# Altium footprint library ParsaLibrary.PcbLib: 526 footprints (part 16 of 33)
Each footprint in its own frame and in the unit in brackets; x right, y up, seen from the top. Pads: shape width x height; smd on the part's side, far side on the other; paste and mask are expansions set on the pad; w line width, h text height; cw(c..) or ccw(c..) is an arc to the next point about the centre after c.
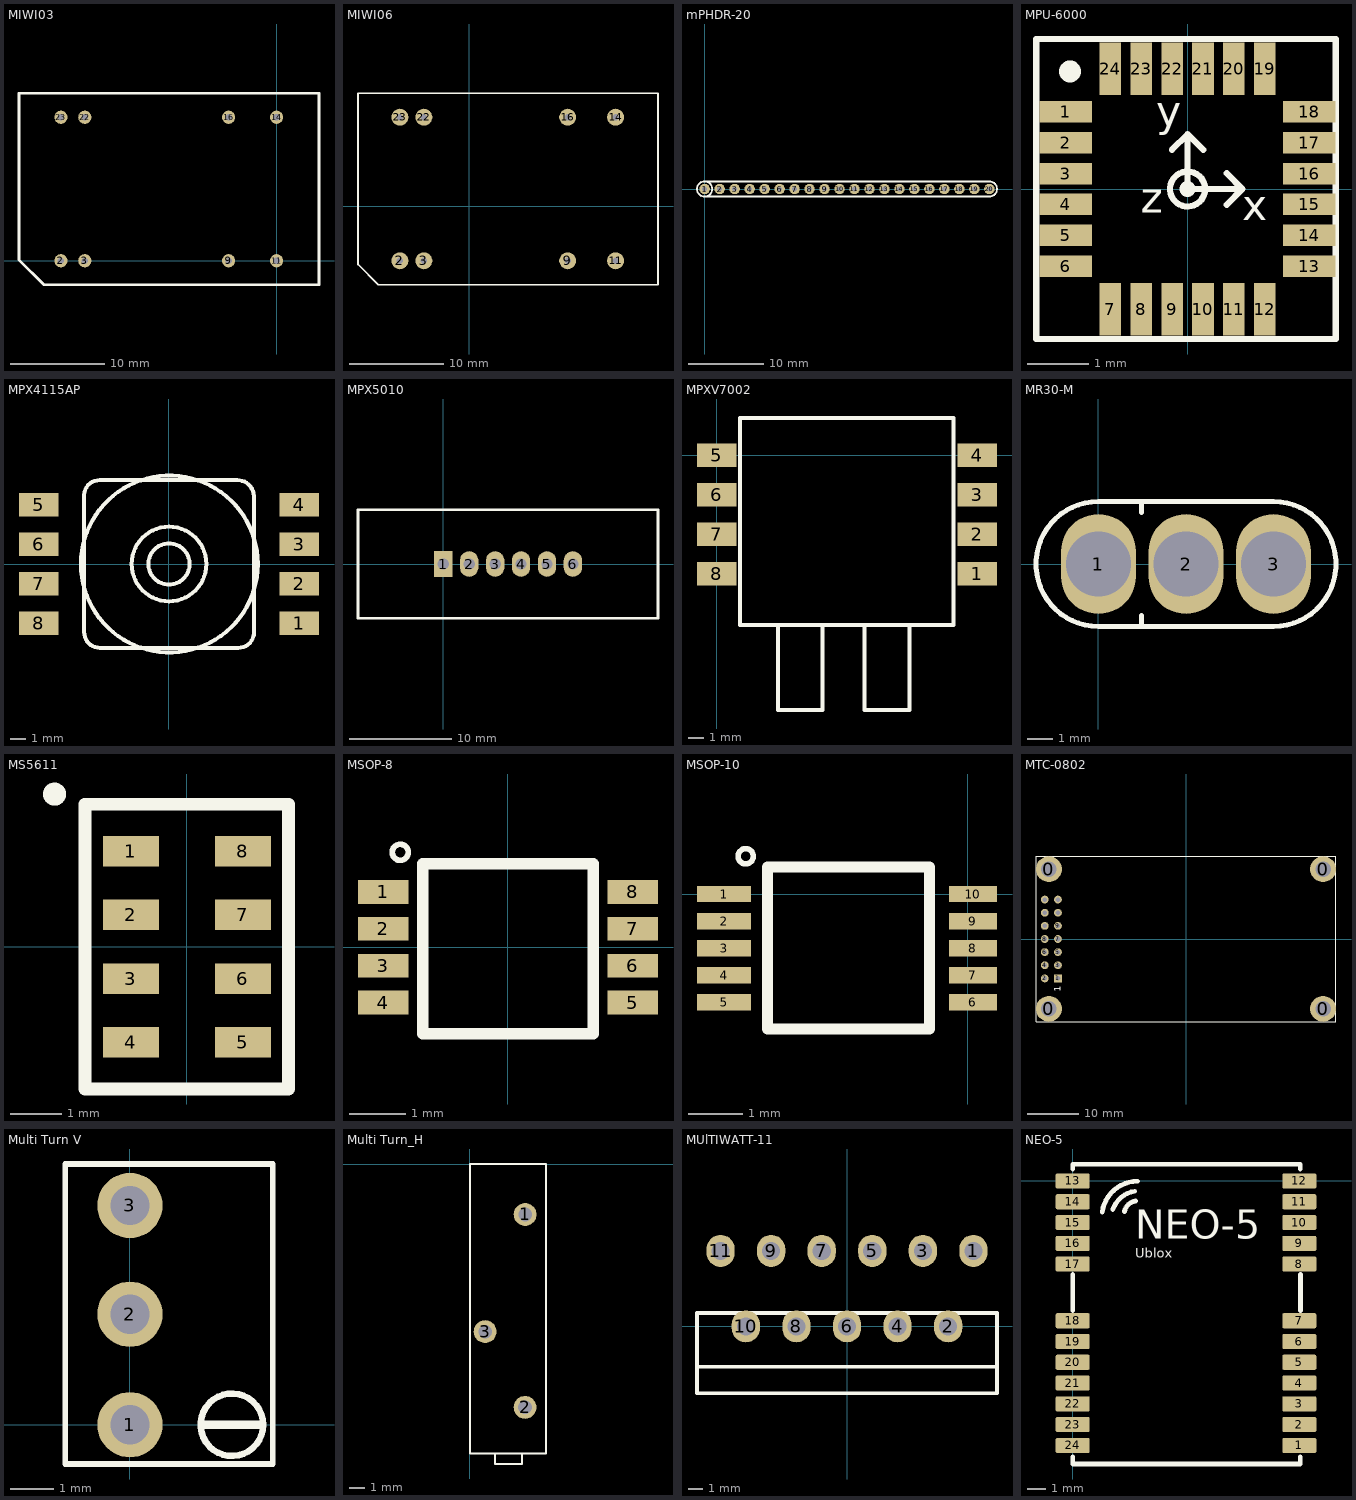
[diagram p15: the footprints below, top view; thin cyan lines are the x and y axes]

## MIWI03 [mm]
pads (8):
  round 1.4 hole 0.7: 2(-22.86,0) 3(-20.32,0) 9(-5.08,0) 11(0,0) 14(0,15.22) 16(-5.08,15.22) 22(-20.32,15.22) 23(-22.86,15.22)
Top Overlay:
  lines w0.3: -27.3,0.097 -24.663,-2.54 4.5,-2.54 4.5,17.76 -27.3,17.76 -27.3,0.097

## MIWI06 [mm] "DC/DC CONVERTER 6W, Single & Dual Output"
pads (8):
  round 1.8 hole 0.7: 2(-7.328,-5.801) 3(-4.788,-5.801) 9(10.452,-5.801) 11(15.532,-5.801) 14(15.532,9.419) 16(10.452,9.419) 22(-4.788,9.419) 23(-7.328,9.419)
Top Overlay:
  lines w0.2: -11.773,11.959 -11.773,-6.182 -9.614,-8.341 20.027,-8.341 ; -11.718,11.959 20.032,11.959 20.032,-8.341
3D body "User Library-MIW4037.step": height 10.25, standoff -4, extent -11.767,-8.377 20.033,11.923

## mPHDR-20 [mm]
pads (20):
  round 1.4 hole 0.7: 1(0,0) 2(2,0) 3(4,0) 4(6,0) 5(8,0) 6(10,0) 7(12,0) 8(14,0) 9(16,0) 10(18,0) 11(20,0) 12(22,0) 13(24,0) 14(26,0) 15(28,0) 16(30,0) 17(32,0) 18(34,0) 19(36,0) 20(38,0)
Top Overlay:
  circle w0.254: c0,0 r1.016
  lines w0.254: 0,-1.016 38,-1.016 ccw(c38,0) 38,1.016 0,1.016

## MPU-6000 [mm] "MPU-6000/MPU-6050"
pads (24):
  rect 0.85x0.35 smd mask+0: 1(-1.975,1.25) 2(-1.975,0.75) 3(-1.975,0.25) 4(-1.975,-0.25) 5(-1.975,-0.75) 6(-1.975,-1.25) 13(1.975,-1.25) 14(1.975,-0.75) 15(1.975,-0.25) 16(1.975,0.25) 17(1.975,0.75) 18(1.975,1.25)
  rect 0.35x0.85 smd mask+0: 7(-1.25,-1.95) 8(-0.75,-1.95) 9(-0.25,-1.95) 10(0.25,-1.95) 11(0.75,-1.95) 12(1.25,-1.95) 19(1.25,1.95) 20(0.75,1.95) 21(0.25,1.95) 22(-0.25,1.95) 23(-0.75,1.95) 24(-1.25,1.95)
Top Overlay:
  circle w0.254: c-1.905,1.905 r0.05
  circle w0.254: c-0.001,0 r0.001
  circle w0.1: c0,0 r0.284
  lines w0.1: -0.254,0.635 0,0.889 ; 0.254,0.635 0,0.889 ; 0.635,-0.254 0.889,0 ; 0.635,0.254 0.889,0 ; 0,0.889 0,0 0.889,0 ; -2.45,-2.43 2.4,-2.43 2.4,2.43 -2.45,2.43 -2.45,-2.43
  text "z" at -0.762,-0.381 h0.5
  text "x" at 0.889,-0.508 h0.5
  text "y" at -0.508,1.016 h0.5

## MPX4115AP [mm]
pads (8):
  rect 2.54x1.524 smd: 1(8.38,-3.81) 2(8.38,-1.27) 3(8.38,1.27) 4(8.38,3.81) 5(-8.38,3.81) 6(-8.38,1.27) 7(-8.38,-1.27) 8(-8.38,-3.81)
Top Overlay:
  circle w0.254: c0.025,0 r5.69
  circle w0.254: c0,0 r2.4
  circle w0.254: c0,0 r1.326
  lines w0.254: -4.445,5.395 ccw(c-4.477,4.413) -5.459,4.445 -5.459,-4.381 ccw(c-4.445,-4.381) -4.445,-5.395 4.444,-5.395 ccw(c4.476,-4.413) 5.458,-4.445 ; -4.382,5.395 4.379,5.395 cw(c4.411,4.348) 5.458,4.381 5.458,-4.572

## MPX5010 [mm]
pads (6):
  rect 1.8x2.5 hole 1.1: 1(0,0)
  oval 1.8x2.5 hole 1.1: 2(2.54,0) 3(5.08,0) 4(7.62,0) 5(10.16,0) 6(12.7,0)
Top Overlay:
  lines w0.254: -8.36,-5.3 -8.36,5.3 21.04,5.3 21.04,-5.3 -8.36,-5.3

## MPXV7002 [mm]
pads (8):
  rect 2.54x1.52 smd: 1(16.76,-7.62) 2(16.76,-5.08) 3(16.76,-2.54) 4(16.76,0) 5(0,0) 6(0,-2.54) 7(0,-5.08) 8(0,-7.62)
Top Overlay:
  lines w0.254: 3.937,-10.922 3.937,-16.4 6.8,-16.4 6.8,-10.922 ; 9.5,-10.922 9.5,-16.4 12.4,-16.4 12.4,-10.922 ; 1.5,-10.922 1.5,2.4 15.24,2.4 15.24,1.27 15.24,-10.922 1.5,-10.922
3D body "MPXV7002.step": height 10.41, standoff -0.25, extent -0.522,-16.563 17.322,2.36

## MR30-M [mm]
pads (3):
  oval 3x4 hole 2.6: 1(0,0) 2(3.5,0) 3(7,0)
Top Overlay:
  lines w0.2: 1.727,-2.5 1.727,-2.068 ; 1.727,2.057 1.727,2.489 ; 0,-2.5 cw(c0,0) 0,2.5 7,2.5 cw(c7,0) 7,-2.5 0,-2.5
3D body "User Library-Amass MR30-M.step": height 10.5, standoff -3, extent -2.55,-2.55 9.55,2.55

## MS5611 [mm] "Digital pressure sensor"
pads (8):
  rect 1.1x0.6 smd: 1(-1.1,1.875) 2(-1.1,0.625) 3(-1.1,-0.625) 4(-1.1,-1.875) 5(1.1,-1.875) 6(1.1,-0.625) 7(1.1,0.625) 8(1.1,1.875)
Top Overlay:
  circle w0.254: c-2.6,3 r0.1
  lines w0.254: -2,-2.795 2,-2.795 2,2.8 -2,2.8 -2,-2.795
3D body "User Library-ms5611_STEP.x_b": height 1.02, standoff -0.01, extent -1.5,-2.5 1.5,2.5

## MSOP-8 [mm]
pads (8):
  rect 0.889x0.42 smd: 1(-2.2,0.975) 2(-2.2,0.325) 3(-2.2,-0.325) 4(-2.2,-0.975) 5(2.2,-0.975) 6(2.2,-0.325) 7(2.2,0.325) 8(2.2,0.975)
Top Overlay:
  circle w0.1: c-1.9,1.675 r0.141
  lines w0.203: -1.5,-1.525 1.5,-1.525 1.5,1.475 -1.5,1.475 -1.5,-1.525
3D body "User Library-MSOP-8-1.step": height 0.92, standoff 0, extent -2.5,-1.525 2.5,1.475

## MSOP-10 [mm]
pads (10):
  rect 1x0.3 smd: 1(-4.5,0) 2(-4.5,-0.5) 3(-4.5,-1) 4(-4.5,-1.5) 5(-4.5,-2)
  rect 0.889x0.3 smd: 6(0.1,-2) 7(0.1,-1.5) 8(0.1,-1) 9(0.1,-0.5) 10(0.1,0)
Top Overlay:
  circle w0.1: c-4.1,0.7 r0.141
  lines w0.203: -3.7,-2.493 -0.7,-2.493 -0.7,0.5 -3.7,0.5 -3.7,-2.493
3D body "User Library-MSOP-10-1.step": height 1.05, standoff 0, extent -4.74,-2.52 0.287,0.48

## MTC-0802 [mm]
pads (18):
  round 5 hole 3: 0(-26.5,-13.5) 0(-26.5,13.5) 0(26.5,-13.5) 0(26.5,13.5)
  rect 1.5x1.5 hole 0.9: 1(-24.76,-7.62)
  round 1.5 hole 0.9: 2(-27.3,-7.62) 3(-24.76,-5.08) 4(-27.3,-5.08) 5(-24.76,-2.54) 6(-27.3,-2.54) 7(-24.76,0) 8(-27.3,0) 9(-24.76,2.54) 10(-27.3,2.54) 11(-24.76,5.08) 12(-27.3,5.08) 13(-24.76,7.62) 14(-27.3,7.62)
Top Overlay:
  lines w0.2: 29,16 -29,16 -29,-16 29,-16 29,16.001
  text "1" at -24.252,-10.16 h1.27
3D body "User Library-lcd_8x2.STEP": height 16.2, standoff 7.99, extent -29,-16 29,16

## Multi Turn V [mm]
pads (3):
  round 1.5 hole 0.9: 1(0,0) 2(0,2.54) 3(0,5.04)
Top Overlay:
  circle w0.15: c2.346,0 r0.718
  lines w0.127: -1.483,-0.902 3.279,-0.902 3.279,5.993 -1.483,5.993 -1.483,-0.902
  lines w0.2: 1.696,0 2.95,0
3D body "User Library-T63YA.step": height 8.2, standoff -2.6, extent -1.422,-0.859 3.278,5.941

## Multi Turn_H [mm]
pads (3):
  round 1.5 hole 0.9: 1(3.627,-3.31) 2(3.621,-15.966) 3(1,-11)
Top Overlay:
  lines w0.127: 1.651,-19.05 1.651,-19.685 3.429,-19.685 3.429,-19.05 ; 0,-19 5,-19 5,0 0,0 0,-19
3D body "User Library-3006P.step": height 6.6, standoff -5.33, extent 0.097,-20.871 4.923,-0.297

## MUlTIWATT-11 [mil]
height 760
pads (11):
  oval 75x85 hole 48: 1(335,200) 2(268,0) 3(201,200) 4(134,0) 5(67,200) 6(0,0) 7(-67,200) 8(-134,0) 9(-201,200) 10(-268,0) 11(-335,200)
Top Overlay:
  lines w10: -397.5,-117 -397.5,-115 ; -397.5,-107 397.5,-107 ; -397.5,-177.17 397.5,-177.17 397.5,35 -397.5,35 -397.5,-177.17
3D body "User Library-Multiwatt11V.step": height 858.27, standoff -125.98, extent -397.64,-179.14 397.64,210.23

## NEO-5 [mm]
pads (24):
  rrect20% 1.8x0.8 smd: 1(12,-14) 2(12,-12.9) 3(12,-11.8) 4(12,-10.7) 5(12,-9.6) 6(12,-8.5) 7(12,-7.4) 8(12,-4.4) 9(12,-3.3) 10(12,-2.2) 11(12,-1.1) 12(12,0) 13(0,0) 14(0,-1.1) 15(0,-2.2) 16(0,-3.3) 17(0,-4.4) 18(0,-7.4) 19(0,-8.5) 20(0,-9.6) 21(0,-10.7) 22(0,-11.8) 23(0,-12.9) 24(0,-14)
Top Overlay:
  lines w0.254: 0,-14.605 0,-14.986 12.047,-14.986 12.047,-14.605 ; 0,-6.858 0,-4.953 ; 0,0.635 0,0.889 12.047,0.889 12.047,0.635 ; 1.565,-1.656 cw(c3.429,-1.893) 3.429,-0.014 ; 2.127,-1.513 cw(c3.496,-1.972) 3.288,-0.542 ; 2.742,-1.617 cw(c3.427,-1.751) 3.328,-1.06 ; 12.065,-6.858 12.065,-4.953
  text "NEO-5" at 3.302,-3.048 h1.52
  text "Ublox" at 3.302,-4.064 h0.5